# Altium footprint library lib_datalogger.PcbLib: 866 footprints (part 49 of 55)
Each footprint in its own frame and in the unit in brackets; x right, y up, seen from the top. Pads: shape width x height; smd on the part's side, far side on the other; paste and mask are expansions set on the pad; w line width, h text height; cw(c..) or ccw(c..) is an arc to the next point about the centre after c.
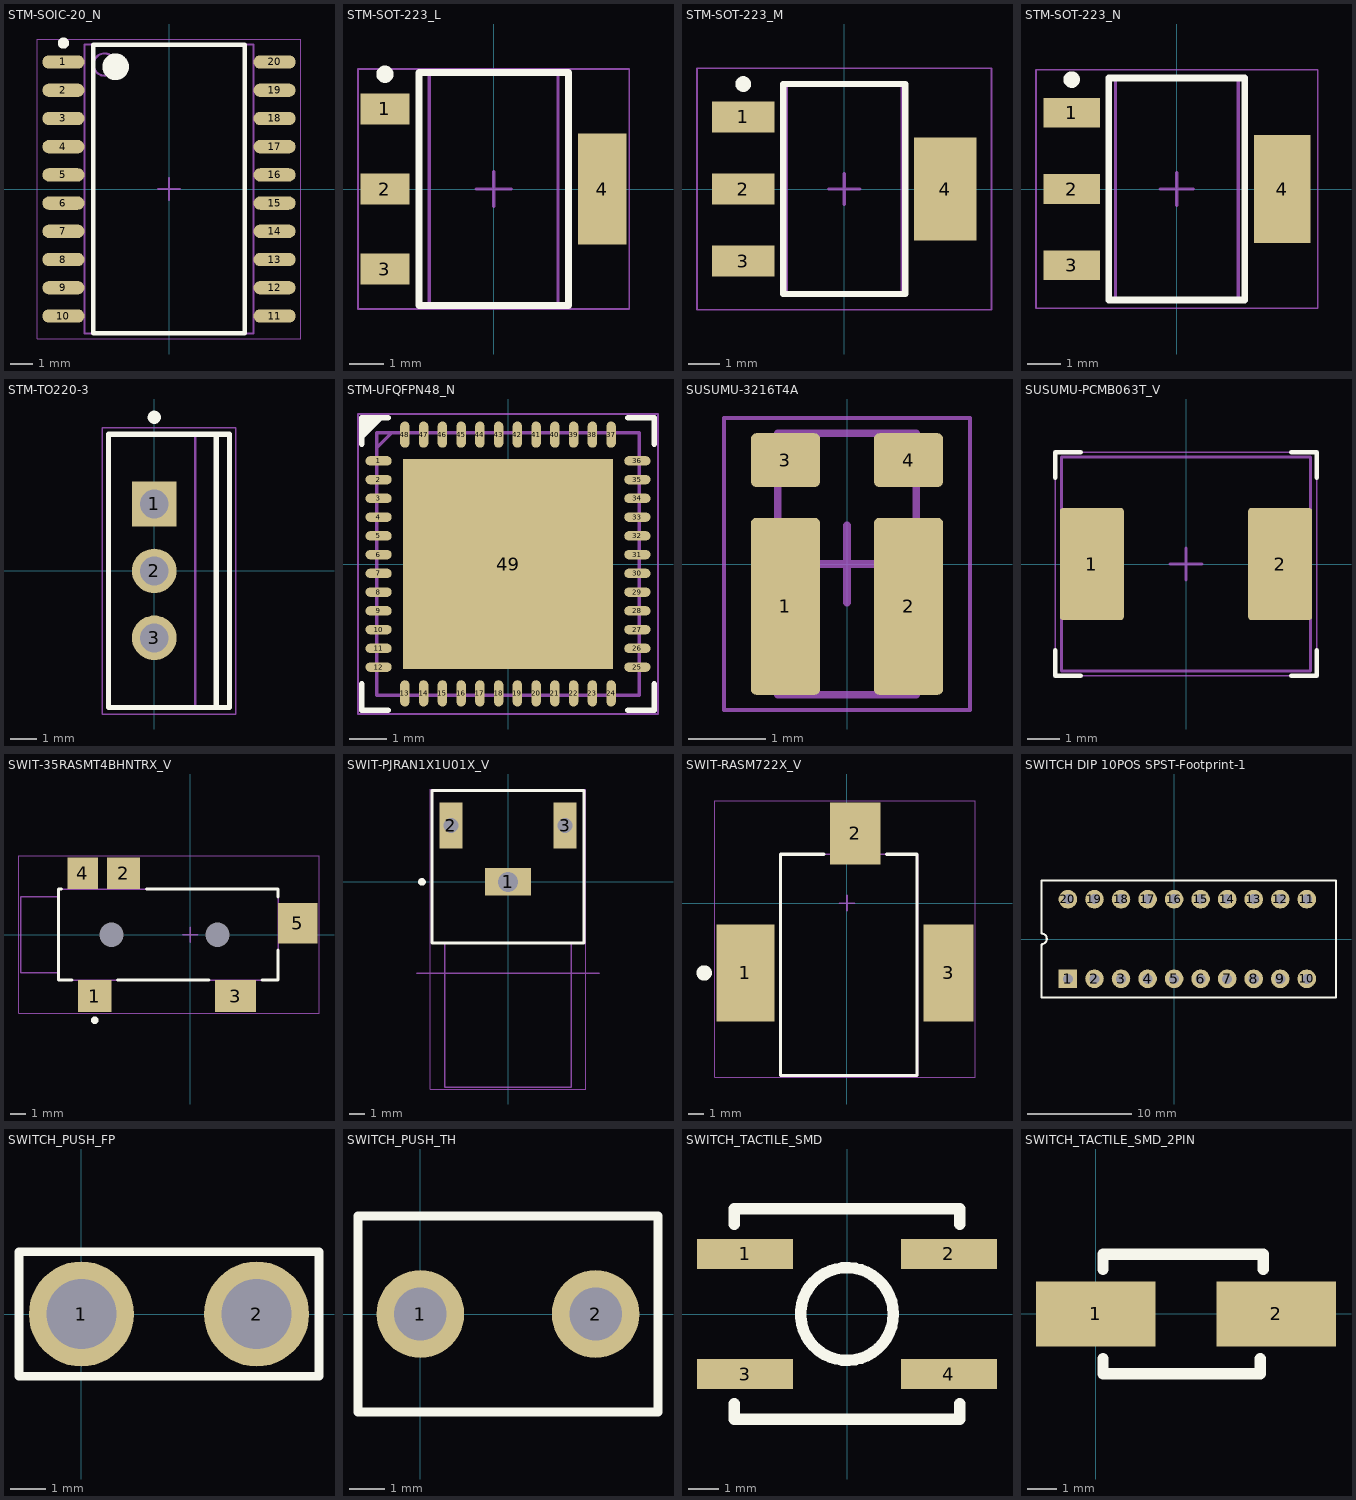
[diagram p48: the footprints below, top view; thin cyan lines are the x and y axes]

## STM-SOIC-20_N [mm] "SOIC, 20-Leads, Body 13x7.6mm, Pitch 1.27mm, IPC Medium Density"
height 2.65
pads (20):
  oval 1.9x0.6 smd: 1(-4.75,5.715) 2(-4.75,4.445) 3(-4.75,3.175) 4(-4.75,1.905) 5(-4.75,0.635) 6(-4.75,-0.635) 7(-4.75,-1.905) 8(-4.75,-3.175) 9(-4.75,-4.445) 10(-4.75,-5.715) 11(4.75,-5.715) 12(4.75,-4.445) 13(4.75,-3.175) 14(4.75,-1.905) 15(4.75,-0.635) 16(4.75,0.635) 17(4.75,1.905) 18(4.75,3.175) 19(4.75,4.445) 20(4.75,5.715)
Top Overlay:
  circle w0.25: c-4.75,6.565 r0.125
  circle w0.6: c-2.4,5.5 r0.3
  lines w0.2: -3.4,-6.5 -3.4,6.5 3.4,6.5 3.4,-6.5 -3.4,-6.5
Mechanical 13:
  circle w0.1: c-2.9,5.6 r0.5
  lines w0.1: -3.8,-6.5 -3.8,6.5 3.8,6.5 3.8,-6.5 -3.8,-6.5
Mechanical 15:
  lines w0.05: -5.925,-6.75 -5.925,6.75 5.925,6.75 5.925,-6.75 -5.925,-6.75
  lines w0.1: -0.5,0 0.5,0 ; 0,-0.5 0,0.5
3D body "SOIC127P1030X265-20N.step": height 2.65, standoff 0, extent -5.162,-6.5 5.162,6.5

## STM-SOT-223_L [mm] "SOT223, 4-Leads, Body 6.7x3.7mm, Pitch 2.3mm, IPC High Density"
height 1.9
pads (4):
  rect 1.4x0.9 smd: 1(-3.125,2.3) 2(-3.125,0) 3(-3.125,-2.3)
  rect 1.4x3.2 smd: 4(3.125,0)
Top Overlay:
  circle w0.25: c-3.125,3.3 r0.125
  lines w0.2: -2.15,-3.35 -2.15,3.35 2.15,3.35 2.15,-3.35 -2.15,-3.35
Mechanical 13:
  lines w0.1: -1.85,-3.35 -1.85,3.35 1.85,3.35 1.85,-3.35 -1.85,-3.35
Mechanical 15:
  lines w0.05: -3.9,-3.45 -3.9,3.45 3.9,3.45 3.9,-3.45 -3.9,-3.45
  lines w0.1: -0.5,0 0.5,0 ; 0,-0.5 0,0.5
3D body "SOT230P700X180-4L.step": height 1.8, standoff 0, extent -3.5,-3.35 3.5,3.35

## STM-SOT-223_M [mm] "SOT223, 4-Leads, Body 6.7x3.7mm, Pitch 2.3mm, IPC Low Density"
height 1.9
pads (4):
  rect 2x1 smd: 1(-3.225,2.3) 2(-3.225,0) 3(-3.225,-2.3)
  rect 2x3.3 smd: 4(3.225,0)
Top Overlay:
  circle w0.25: c-3.225,3.35 r0.125
  lines w0.2: -1.95,-3.35 1.95,-3.35 1.95,3.35 -1.95,3.35 -1.95,-3.35
Mechanical 13:
  lines w0.1: -1.85,-3.35 1.85,-3.35 1.85,3.35 -1.85,3.35 -1.85,-3.35
Mechanical 15:
  lines w0.05: -4.7,-3.85 4.7,-3.85 4.7,3.85 -4.7,3.85 -4.7,-3.85
  lines w0.1: -0.5,0 0.5,0 ; 0,-0.5 0,0.5
3D body "SOT230P700X180-4M.step": height 1.8, standoff 0, extent -3.5,-3.35 3.5,3.35

## STM-SOT-223_N [mm] "SOT223, 4-Leads, Body 6.7x3.7mm, Pitch 2.3mm, IPC Medium Density"
height 1.9
pads (4):
  rect 1.7x0.9 smd: 1(-3.175,2.3) 2(-3.175,0) 3(-3.175,-2.3)
  rect 1.7x3.25 smd: 4(3.175,0)
Top Overlay:
  circle w0.25: c-3.175,3.3 r0.125
  lines w0.2: -2.05,-3.35 -2.05,3.35 2.05,3.35 2.05,-3.35 -2.05,-3.35
Mechanical 13:
  lines w0.1: -1.85,-3.35 -1.85,3.35 1.85,3.35 1.85,-3.35 -1.85,-3.35
Mechanical 15:
  lines w0.05: -4.25,-3.6 -4.25,3.6 4.25,3.6 4.25,-3.6 -4.25,-3.6
  lines w0.1: -0.5,0 0.5,0 ; 0,-0.5 0,0.5
3D body "SOT230P700X180-4N.step": height 1.8, standoff 0, extent -3.5,-3.35 3.5,3.35

## STM-TO220-3 [mm] "FM, 3-Leads, Body 10.4x4.6mm, Pitch 2.55mm"
height 19.68
pads (3):
  rect 1.7x1.7 hole 1.1: 1(0,2.55)
  round 1.7 hole 1.1: 2(0,0) 3(0,-2.55)
Top Overlay:
  circle w0.25: c0,5.85 r0.125
  lines w0.2: 2.36,-5.2 2.36,5.2 ; -1.74,-5.2 2.86,-5.2 2.86,5.2 -1.74,5.2 -1.74,-5.2
Mechanical 13:
  lines w0.1: 1.56,-5.2 1.56,5.2 ; -1.74,-5.2 -1.74,5.2 2.86,5.2 2.86,-5.2 -1.74,-5.2
Mechanical 15:
  lines w0.05: -1.99,-5.45 -1.99,5.45 3.11,5.45 3.11,-5.45 -1.99,-5.45
  lines w0.1: -0.5,0 0.5,0 ; 0,-0.5 0,0.5
3D body: height 3.5, standoff 0, extent -0.3,1.84 0.3,3.26
3D body: height 0, standoff -1.6, extent -0.3,2.175 0.3,2.925
3D body: height 3.5, standoff 0, extent -0.3,-0.71 0.3,0.71
3D body: height 0, standoff -1.6, extent -0.3,-0.375 0.3,0.375
3D body: height 3.5, standoff 0, extent -0.3,-3.26 0.3,-1.84
3D body: height 0, standoff -1.6, extent -0.3,-2.925 0.3,-2.175
3D body: height 13.28, standoff 3.5, extent -1.74,-5.2 2.86,5.2
3D body: height 14.98, standoff 13.28, extent 1.56,-5.1 2.86,5.1
3D body: height 15.02, standoff 14.98, extent 1.56,0.371 2.86,5.1
3D body: height 15.02, standoff 14.98, extent 1.56,-5.1 2.86,-0.371
3D body: height 18.78, standoff 18.74, extent 1.56,0.371 2.86,5.1
3D body: height 18.78, standoff 18.74, extent 1.56,-5.1 2.86,-0.371
3D body: height 15.13, standoff 15.02, extent 1.56,0.727 2.86,5.1
3D body: height 15.13, standoff 15.02, extent 1.56,-5.1 2.86,-0.727
3D body: height 18.75, standoff 18.64, extent 1.56,0.727 2.86,5.1
3D body: height 18.75, standoff 18.64, extent 1.56,-5.1 2.86,-0.727
3D body: height 15.31, standoff 15.12, extent 1.56,1.056 2.86,5.1
3D body: height 15.31, standoff 15.12, extent 1.56,-5.1 2.86,-1.056
3D body: height 18.64, standoff 18.46, extent 1.56,1.056 2.86,5.1
3D body: height 18.64, standoff 18.46, extent 1.56,-5.1 2.86,-1.056
3D body: height 15.54, standoff 15.3, extent 1.56,1.344 2.86,5.1
3D body: height 15.54, standoff 15.3, extent 1.56,-5.1 2.86,-1.344
3D body: height 18.46, standoff 18.22, extent 1.56,1.344 2.86,5.1
3D body: height 18.46, standoff 18.22, extent 1.56,-5.1 2.86,-1.344
3D body: height 15.83, standoff 15.54, extent 1.56,1.58 2.86,5.1
3D body: height 15.83, standoff 15.54, extent 1.56,-5.1 2.86,-1.58
3D body: height 18.23, standoff 17.94, extent 1.56,1.58 2.86,5.1
3D body: height 18.23, standoff 17.94, extent 1.56,-5.1 2.86,-1.58
3D body: height 16.16, standoff 15.82, extent 1.56,1.755 2.86,5.1
3D body: height 16.16, standoff 15.82, extent 1.56,-5.1 2.86,-1.755
3D body: height 17.94, standoff 17.61, extent 1.56,1.755 2.86,5.1
3D body: height 17.94, standoff 17.61, extent 1.56,-5.1 2.86,-1.755
3D body: height 16.51, standoff 16.15, extent 1.56,1.863 2.86,5.1
3D body: height 16.51, standoff 16.15, extent 1.56,-5.1 2.86,-1.863
3D body: height 17.61, standoff 17.25, extent 1.56,1.863 2.86,5.1
3D body: height 17.61, standoff 17.25, extent 1.56,-5.1 2.86,-1.863
3D body: height 16.88, standoff 16.51, extent 1.56,1.9 2.86,5.1
3D body: height 16.88, standoff 16.51, extent 1.56,-5.1 2.86,-1.9
3D body: height 17.26, standoff 16.88, extent 1.56,1.9 2.86,5.1
3D body: height 17.26, standoff 16.88, extent 1.56,-5.1 2.86,-1.9
3D body: height 19.68, standoff 18.78, extent 1.56,-5.1 2.86,5.1

## STM-UFQFPN48_N [mm]
pads (49):
  oval 0.7x0.25 smd: 1(-3.45,2.75) 2(-3.45,2.25) 3(-3.45,1.75) 4(-3.45,1.25) 5(-3.45,0.75) 6(-3.45,0.25) 7(-3.45,-0.25) 8(-3.45,-0.75) 9(-3.45,-1.25) 10(-3.45,-1.75) 11(-3.45,-2.25) 12(-3.45,-2.75) 25(3.45,-2.75) 26(3.45,-2.25) 27(3.45,-1.75) 28(3.45,-1.25) 29(3.45,-0.75) 30(3.45,-0.25) 31(3.45,0.25) 32(3.45,0.75) 33(3.45,1.25) 34(3.45,1.75) 35(3.45,2.25) 36(3.45,2.75)
  oval 0.25x0.7 smd: 13(-2.75,-3.45) 14(-2.25,-3.45) 15(-1.75,-3.45) 16(-1.25,-3.45) 17(-0.75,-3.45) 18(-0.25,-3.45) 19(0.25,-3.45) 20(0.75,-3.45) 21(1.25,-3.45) 22(1.75,-3.45) 23(2.25,-3.45) 24(2.75,-3.45) 37(2.75,3.45) 38(2.25,3.45) 39(1.75,3.45) 40(1.25,3.45) 41(0.75,3.45) 42(0.25,3.45) 43(-0.25,3.45) 44(-0.75,3.45) 45(-1.25,3.45) 46(-1.75,3.45) 47(-2.25,3.45) 48(-2.75,3.45)
  rect 5.6x5.6 smd paste-3: 49(0,0)
Top Overlay:
  region: -3.9,3.9 -3.9,3.4 -3.4,3.9
  lines w0.15: -3.9,-3.2 -3.9,-3.9 -3.2,-3.9 ; -3.9,3.2 -3.9,3.9 -3.2,3.9 ; -3.9,3.4 -3.4,3.9 ; 3.2,-3.9 3.9,-3.9 3.9,-3.2 ; 3.2,3.9 3.9,3.9 3.9,3.2
Top Paste:
  rectangle: -2.7,0.2 -0.2,2.7
  rectangle: -2.7,-2.7 -0.2,-0.2
  rectangle: 0.2,-2.7 2.7,-0.2
  rectangle: 0.2,0.2 2.7,2.7
Mechanical 1:
  lines w0.1: -0.5,0 0.5,0 ; 0,-0.5 0,0.5
Mechanical 3:
  text ".Designator" at 0,0 h1
Mechanical 21:
  lines w0.05: -4,-4 -4,4 4,4 4,-4 -4,-4
Mechanical 23:
  lines w0.1: -3.5,3.1 -3.1,3.5 ; -3.5,-3.5 -3.5,3.5 3.5,3.5 3.5,-3.5 -3.5,-3.5
3D body "User Library-UFQFPN48.step": height 0.55, standoff 0, extent -3.5,-3.5 3.5,3.5

## SUSUMU-3216T4A [mm] "SMD, 4-Leads, Body 3.2x1.6mm"
height 0.7
pads (4):
  rrect15% 0.9x2.3 smd: 1(-0.8,-0.55) 2(0.8,-0.55)
  rrect20% 0.9x0.7 smd: 3(-0.8,1.35) 4(0.8,1.35)
Mechanical 13:
  lines w0.1: -0.9,-1.7 -0.9,1.7 0.9,1.7 0.9,-1.7 -0.9,-1.7
Mechanical 15:
  lines w0.05: -1.6,-1.9 -1.6,1.9 1.6,1.9 1.6,-1.9 -1.6,-1.9
  lines w0.1: -0.5,0 0.5,0 ; 0,-0.5 0,0.5
Top Designator:
  text ".Designator" at -1.27,-0.127 h0.6
3D body: height 0.5, standoff 0, extent -0.8,-1.6 0.8,1.6
3D body: height 0.55, standoff 0.05, extent -0.7,-1.5 0.7,1.5

## SUSUMU-PCMB063T_V [mm] "SMD, 2-Leads, Body 7.8x6.7mm"
height 3
pads (2):
  rrect8% 2x3.5 smd: 1(-2.95,0) 2(2.95,0)
Top Overlay:
  lines w0.15: -4.1,-2.7 -4.1,-3.5 -3.3,-3.5 ; -4.1,2.7 -4.1,3.5 -3.3,3.5 ; 3.3,-3.5 4.1,-3.5 4.1,-2.7 ; 3.3,3.5 4.1,3.5 4.1,2.7
Mechanical 13:
  lines w0.1: -3.9,-3.35 -3.9,3.35 3.9,3.35 3.9,-3.35 -3.9,-3.35
Mechanical 15:
  lines w0.05: -4.1,-3.5 4.1,-3.5 4.1,3.5 -4.1,3.5 -4.1,-3.5
  lines w0.1: -0.5,0 0.5,0 ; 0,-0.5 0,0.5
Top Designator:
  text ".Designator" at -1.397,-0.127 h0.6
3D body: height 1.8, standoff 0, extent 2.25,-1.6 3.65,1.6
3D body: height 1.8, standoff 0, extent -3.65,-1.6 -2.25,1.6
3D body: height 3, standoff 0.05, extent -3.45,-3.4 3.45,3.4

## SWIT-35RASMT4BHNTRX_V [mm] "Jack, 5-Leads, Body 17x6mm"
height 5
pads (7):
  rect 2.2x2.1 smd: 1(-6.3,-4.05) 2(-4.4,4.05)
  rect 2.7x2.1 smd: 3(3,-4.05)
  rect 2x2.1 smd: 4(-7.1,4.05)
  rect 2.6x2.7 smd: 5(7.1,0.75)
  rect 0x0 hole 1.6 unplated: MH(-5.2,0) MH(1.8,0)
Top Overlay:
  circle w0.25: c-6.3,-5.65 r0.125
  lines w0.2: -8.5,3 -8.7,3 -8.7,-3 -7.8,-3 ; -4.8,-3 1.25,-3 ; -2.9,3 5.8,3 5.8,2.5 ; 4.75,-3 5.8,-3 5.8,-1
Mechanical 13:
  lines w0.1: -8.7,-2.499 -11.2,-2.499 -11.2,2.499 -8.7,2.499 ; -8.7,-3 -8.7,3 5.8,3 5.8,-3 -8.7,-3
Mechanical 15:
  lines w0.05: -11.3,-5.2 -11.3,5.2 8.5,5.2 8.5,-5.2 -11.3,-5.2
  lines w0.1: -0.5,0 0.5,0 ; 0,-0.5 0,0.5
3D body: height 0, standoff -0.8, extent -5.95,-0.75 -4.45,0.75
3D body: height 5, standoff 0, extent -11.2,-2.499 -8.7,2.499
3D body: height 5, standoff 0, extent -8.7,-3 5.8,3
3D body: height 0, standoff -0.8, extent 1.05,-0.75 2.55,0.75
3D body: height 4.3, standoff 0.7, extent -11.201,-1.8 -8.7,1.8

## SWIT-PJRAN1X1U01X_V [mm] "Jack, 3-Leads, Body 19.5x10mm"
pads (3):
  rect 3x1.8 hole 1.3 square paste-1: 1(0,0)
  rect 1.5x3 hole 1 square paste-1: 2(-3.75,3.7) 3(3.75,3.7)
Top Overlay:
  circle w0.25: c-5.65,0 r0.125
  lines w0.2: -5,-4 5,-4 5,6 -5,6 -5,-4
Top Assembly:
  lines w0.1: -6,-6 6,-6
  text "PCB Edge" at 5.461,-5.588 h0.65
Mechanical 13:
  lines w0.1: -4.15,-4 -4.15,-13.5 4.15,-13.5 4.15,-4 ; -2,-4 2,-4 ; -5,-4 5,-4 5,6 -5,6 -5,-4
Mechanical 15:
  lines w0.05: -5.1,-13.6 5.1,-13.6 5.1,6.1 -5.1,6.1 -5.1,-13.6
  lines w0.1: -0.5,0 0.5,0 ; 0,-0.5 0,0.5
3D body: height 9.7, standoff 6.3, extent -1.7,-13.501 1.7,-4
3D body: height 13, standoff 0, extent 2,-4 5,6
3D body: height 13, standoff 0, extent -5,-4 -2,6
3D body: height 12.15, standoff 1.5, extent -2,-4 2,6
3D body: height 12.15, standoff 3.85, extent -4.15,-13.5 4.15,-4

## SWIT-RASM722X_V [mm] "SMD, 3-Leads, Body 14.5x9mm"
height 11
pads (3):
  rect 3.81x6.35 smd: 1(-6.645,-4.57)
  rect 3.3x4.06 smd: 2(0.545,4.57)
  rect 3.3x6.35 smd: 3(6.645,-4.57)
Top Overlay:
  circle w0.5: c-9.35,-4.57 r0.25
  lines w0.2: -1.505,3.2 -4.34,3.2 -4.34,-11.3 4.595,-11.3 4.595,3.2 2.595,3.2
Mechanical 13:
  lines w0.1: -4.373,-11.3 4.627,-11.3 4.628,3.2 -4.373,3.2 -4.373,-11.3
Mechanical 15:
  lines w0.05: -8.65,-11.4 8.395,-11.4 8.395,6.7 -8.65,6.7 -8.65,-11.4
  lines w0.1: -0.5,0 0.5,0 ; 0,-0.5 0,0.5
3D body "RASM722X.STEP": height 11.1, standoff 0.04, extent -7.504,-11.227 7.505,5.842

## SWITCH DIP 10POS SPST-Footprint-1 [mil]
pads (20):
  rect 70x70 hole 38: 1(-400,-150)
  round 70 hole 38: 2(-300,-150) 3(-200,-150) 4(-100,-150) 5(0,-150) 6(100,-150) 7(200,-150) 8(300,-150) 9(400,-150) 10(500,-150) 11(500,150) 12(400,150) 13(300,150) 14(200,150) 15(100,150) 16(0,150) 17(-100,150) 18(-200,150) 19(-300,150) 20(-400,150)
Top Overlay:
  lines w7.87: -500,-25 -500,-220 610,-220 610,220 -500,220 -500,20 ; -500,-20 ccw(c-500,0.3) -500,20.6
3D body "User Library-DIP SWITCH 10 POS CTS 206.STEP": height 324.8, standoff -137.8, extent -492.91,-192.52 592.91,192.52

## SWITCH_PUSH_FP [mm]
pads (2):
  round 3 hole 2: 1(0,0) 2(5,0)
Top Overlay:
  lines w0.254: -1.782,-1.778 6.782,-1.778 6.782,1.778 -1.782,1.778 -1.782,-1.778
3D body "switch-push.step": height 24.05, standoff -3.64, extent -2.453,-4.953 7.453,4.953

## SWITCH_PUSH_TH [mm]
pads (2):
  round 2.5 hole 1.5: 1(0,0) 2(5,0)
Top Overlay:
  lines w0.254: -1.782,-2.794 -1.782,2.794 6.782,2.794 6.782,-2.794 -1.782,-2.794
3D body "chave.stp": height 18.85, standoff -3.3, extent -1.565,-2.543 6.565,2.54

## SWITCH_TACTILE_SMD [mm]
height 2.5
pads (4):
  rect 3.2x1 smd: 1(-3.4,2) 2(3.4,2) 3(-3.4,-2) 4(3.4,-2)
Top Overlay:
  circle w0.381: c0,0 r1.545
  lines w0.381: -3.759,-2.997 -3.759,-3.505 3.759,-3.505 3.759,-2.997 ; -3.759,2.997 -3.759,3.505 3.759,3.505 3.759,2.997
3D body "20035.stp": height 3.4, standoff 0, extent -3.5,-3.25 3.5,3.25

## SWITCH_TACTILE_SMD_2PIN [mm]
height 2.5
pads (2):
  rect 4x2.16 smd: 1(0,0) 2(6.04,0)
Top Overlay:
  lines w0.381: 0.241,-1.497 0.241,-2.005 5.5,-2.005 5.5,-1.497 ; 0.241,1.497 0.241,2.005 5.6,2.005 5.6,1.497
3D body "PTS820J25KP.stp": height 2.5, standoff -0.5, extent 0.6,-1.35 5,1.55